# Altium footprint library pads.PcbLib: 27 footprints (part 2 of 2)
Each footprint in its own frame and in the unit in brackets; x right, y up, seen from the top. Pads: shape width x height; smd on the part's side, far side on the other; paste and mask are expansions set on the pad; w line width, h text height; cw(c..) or ccw(c..) is an arc to the next point about the centre after c.
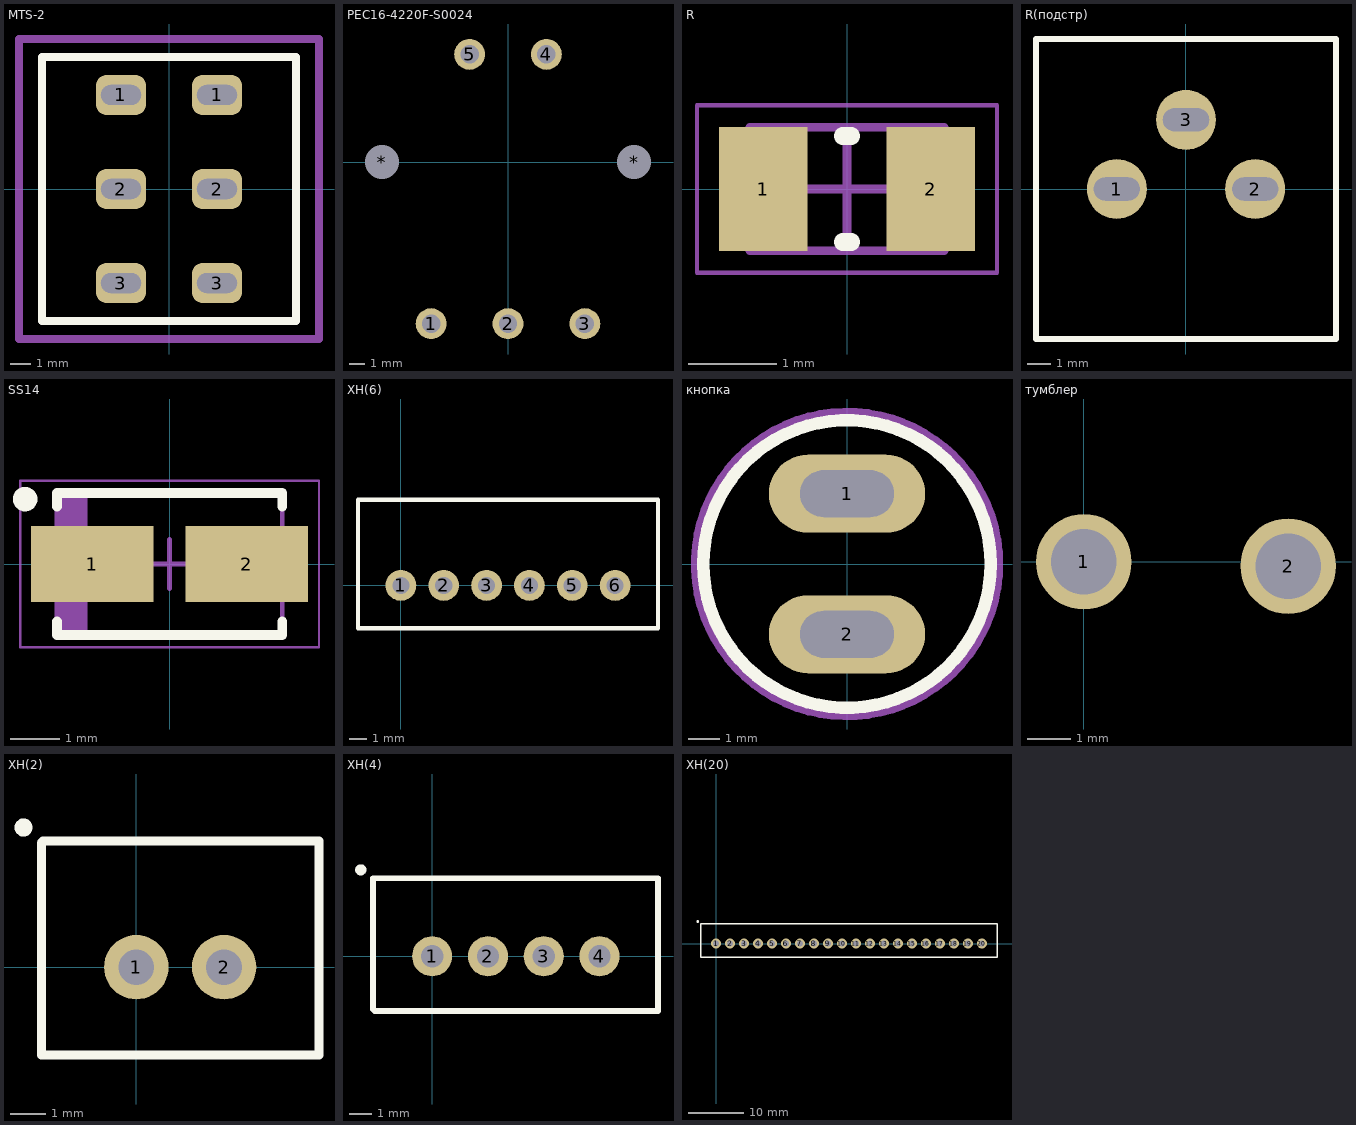
[diagram p1: the footprints below, top view; thin cyan lines are the x and y axes]

## MTS-2 [mm]
pads (6):
  rrect50% 2.5x2 hole 1 slot 2 at 0 deg: 1(-2.4,4.7) 1(2.4,4.7) 2(-2.4,0) 2(2.4,0) 3(-2.4,-4.7) 3(2.4,-4.7)
Top Overlay:
  lines w0.4: -6.35,-6.6 6.35,-6.6 6.35,6.6 -6.35,6.6 -6.35,-6.6
Mechanical 15:
  lines w0.4: -7.5,-7.5 7.5,-7.5 7.5,7.5 -7.5,7.5 -7.5,6.6 -7.5,-7.5
3D body "User Library-MTS-20x-A2.step": height 29.34, standoff -5.3, extent -6.35,-6.6 6.35,6.6

## PEC16-4220F-S0024 [mm]
pads (7):
  round 2 hole 1.2: 1(-5,-10.5) 2(0,-10.5) 3(5,-10.5) 4(2.5,7) 5(-2.5,7)
  round 2 hole 2.2 unplated: *(-8.2,0) *(8.2,0)
3D body "User Library-Encoder PEC16-4220F-S0024 BOURNS.step": height 28.3, standoff -3.2, extent -8.25,-12.5 8.25,8.3

## R [mm] "Chip Resistor, 2-Leads, Body 2,10x1,30mm, IPC Medium Density"
height 0.6
pads (2):
  rect 1x1.4 smd: 1(-0.95,0) 2(0.95,0)
Top Overlay:
  lines w0.2: -0.05,-0.6 0.05,-0.6 ; -0.05,0.6 0.05,0.6
Mechanical 13:
  lines w0.1: -1.1,-0.7 1.1,-0.7 1.1,0.7 -1.1,0.7 -1.1,-0.7
Mechanical 15:
  lines w0.05: -1.7,-0.95 1.7,-0.95 1.7,0.95 -1.7,0.95 -1.7,-0.95
  lines w0.1: -0.5,0 0.5,0 ; 0,-0.5 0,0.5
3D body "RESC2113X06N.step": height 0.6, standoff 0, extent -1.1,-0.7 1.1,0.7

## R(подстр) [mm]
pads (3):
  round 2.6 hole 1 slot 2 at 0 deg: 1(-3,0) 2(3,0) 3(0,3)
Top Overlay:
  lines w0.254: -6.5,-6.5 6.5,-6.5 6.5,6.5 -6.5,6.5 -6.5,0 -6.5,-6.5 ; -6.5,-6.5 -6.5,-6.5
3D body: height 6, standoff 0.5, extent -6.5,-6.3 6.3,6.5
3D body: height 0.5, standoff 0.5, extent 2.107,-0.898 3.9,0.898
3D body: height 0.5, standoff 0.5, extent -0.893,2.102 0.9,3.899
3D body: height 0.5, standoff 0.5, extent -3.893,-0.898 -2.1,0.898

## SS14 [mm] "Molded Diode, 2-Leads, Body 4,30x2,70mm, IPC Medium Density"
height 2.44
pads (2):
  rect 2.5x1.55 smd: 1(-1.575,0) 2(1.575,0)
Top Overlay:
  circle w0.25: c-2.95,1.325 r0.125
  lines w0.2: -2.3,-1.175 -2.3,-1.45 2.3,-1.45 2.3,-1.175 ; -2.3,1.175 -2.3,1.45 2.3,1.45 2.3,1.175
Mechanical 13:
  rectangle: -2.3,-1.45 -1.681,1.45
  lines w0.1: -2.3,-1.45 -2.3,1.45 2.3,1.45 2.3,-1.45 -2.3,-1.45
Mechanical 15:
  lines w0.05: -3.05,-1.7 -3.05,1.7 3.05,1.7 3.05,-1.7 -3.05,-1.7
  lines w0.1: -0.5,0 0.5,0 ; 0,-0.5 0,0.5
3D body "DIOM4327X24N.step": height 2.44, standoff 0, extent -2.52,-1.45 2.52,1.45

## XH(6) [mm]
pads (6):
  round 1.8 hole 1: 1(0,0) 2(2.5,0) 3(5,0) 4(7.5,0) 5(10,0) 6(12.5,0)
Top Overlay:
  lines w0.254: -2.5,-2.5 -2.5,2.5 -2.5,5 15,5 15,-2.5 -2.5,-2.5
3D body "User Library-jst-b6b-xh-a.step": height 7, standoff -3.4, extent -2.45,-2.35 14.95,3.4

## кнопка [mm]
pads (2):
  oval 5x2.5 hole 1.5 slot 3 at 0 deg: 1(0,2.25) 2(0,-2.25)
Top Overlay:
  circle w0.4: c0,0 r4.6
Mechanical 15:
  circle w0.4: c0,0 r4.8
3D body "User Library-PBS-10B.STEP": height 22.6, standoff -5.15, extent -4.75,-4.75 4.75,4.75

## тумблер [mm]
pads (2):
  round 2.2 hole 1.5: 1(0,0) 2(4.7,-0.1)
3D body "User Library-toggle_mts1_assembly.STEP": height 31.17, standoff -5, extent -1.6,-5.799 10.9,5.799

## ХН(2) [mm]
pads (2):
  round 1.8 hole 1: 1(0,0) 2(2.45,0)
Top Overlay:
  circle w0.25: c-3.15,3.9 r0.125
  lines w0.254: -2.65,-2.45 -2.65,3.475 -2.6,3.525 5.1,3.525 5.1,-2.45 -2.65,-2.45
3D body "User Library-PW10-2-M black.step": height 7, standoff -3.3, extent -2.55,-2.325 4.95,3.375

## ХН(4) [mm]
pads (4):
  round 1.8 hole 1: 1(0,0) 2(2.5,0) 3(5,0) 4(7.5,0)
Top Overlay:
  circle w0.25: c-3.2,3.875 r0.125
  lines w0.254: -2.65,-2.375 -2.65,3.5 10.125,3.5 10.125,-2.45 -2.575,-2.45 -2.65,-2.375
3D body "User Library-PW10-4-M black.step": height 7, standoff -3.3, extent -2.525,-2.3 9.975,3.4

## ХН(20) [mm]
pads (20):
  round 1.8 hole 1: 1(0,0) 2(2.5,0) 3(5,0) 4(7.5,0) 5(10,0) 6(12.5,0) 7(15,0) 8(17.5,0) 9(20,0) 10(22.5,0) 11(25,0) 12(27.5,0) 13(30,0) 14(32.5,0) 15(35,0) 16(37.5,0) 17(40,0) 18(42.5,0) 19(45,0) 20(47.5,0)
Top Overlay:
  circle w0.25: c-3.275,3.925 r0.125
  lines w0.254: -2.725,-2.425 -2.725,3.55 50.2,3.55 50.2,-2.425 -2.725,-2.425
3D body "User Library-PW10-20-M black.step": height 7, standoff -3.3, extent -2.55,-2.3 50.05,3.4